# Altium footprint library CeleronLib_SMD.PcbLib: 198 footprints (part 7 of 13)
Each footprint in its own frame and in the unit in brackets; x right, y up, seen from the top. Pads: shape width x height; smd on the part's side, far side on the other; paste and mask are expansions set on the pad; w line width, h text height; cw(c..) or ccw(c..) is an arc to the next point about the centre after c.
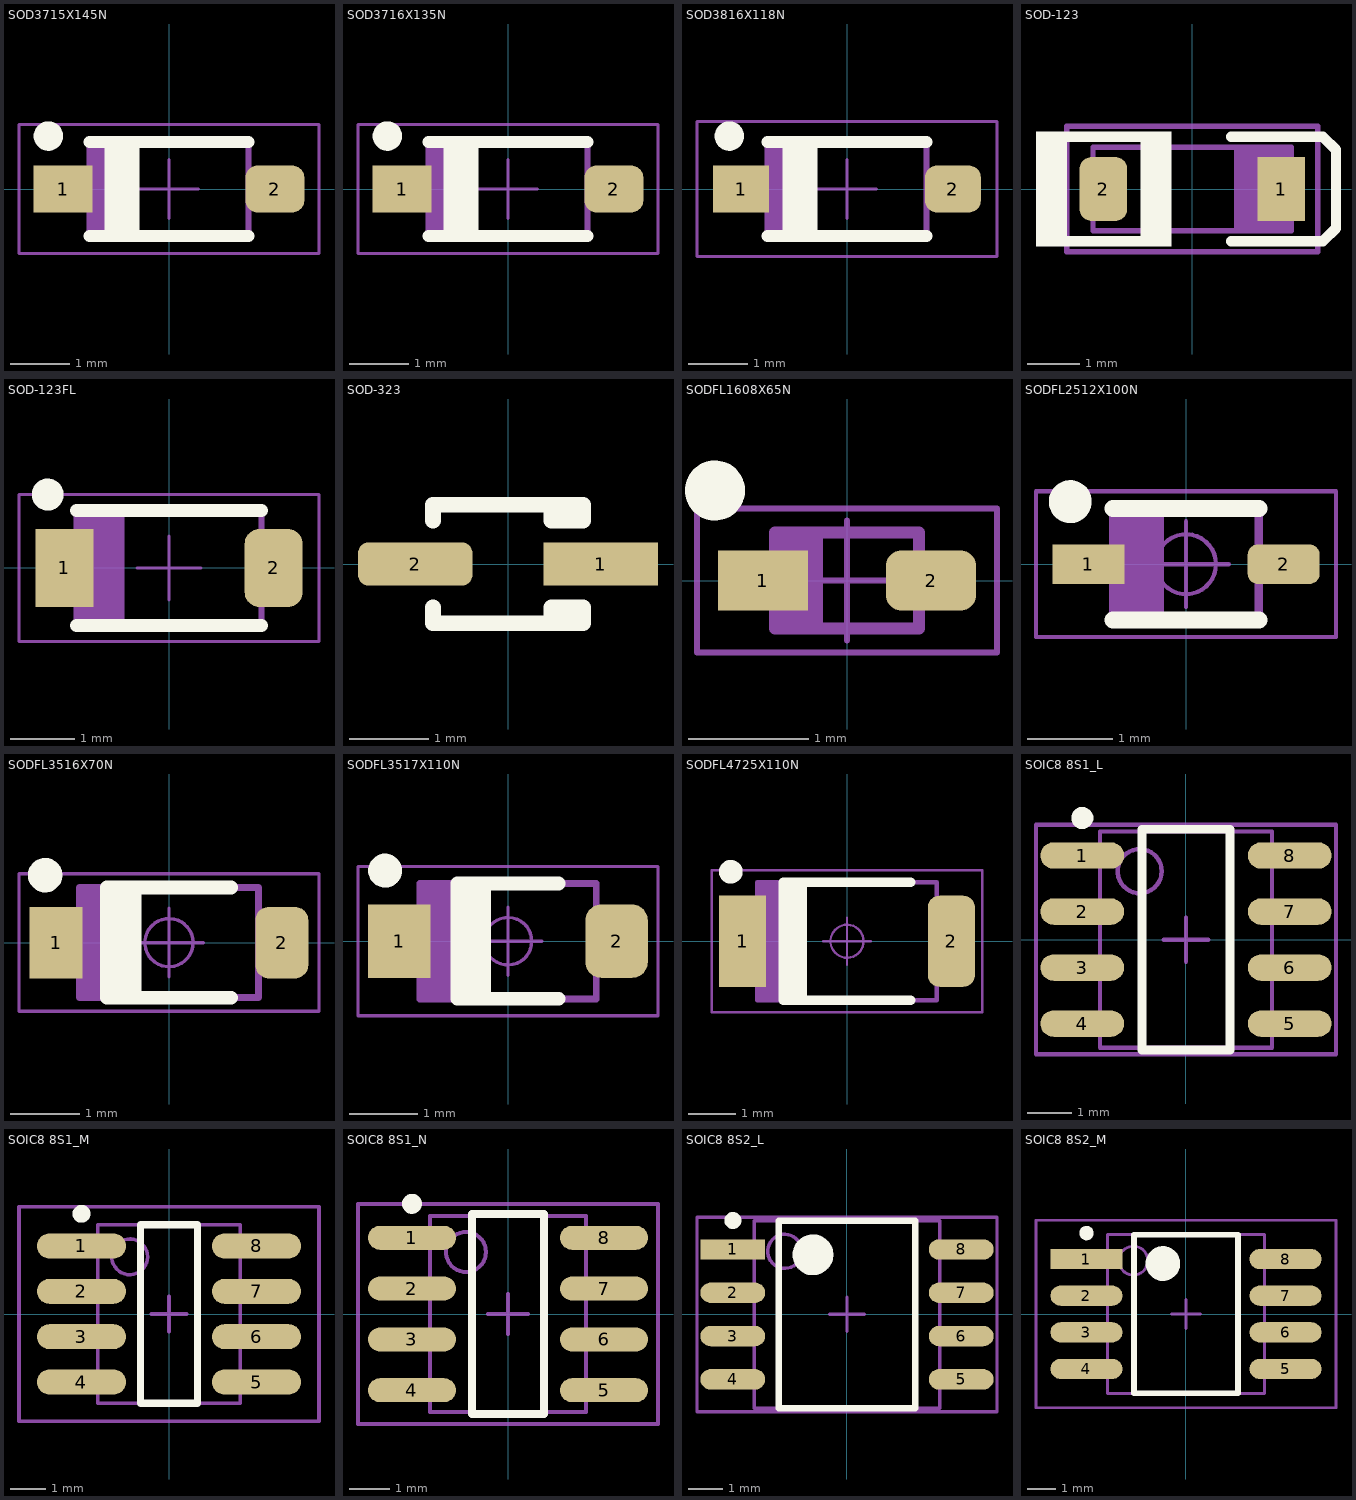
[diagram p6: the footprints below, top view; thin cyan lines are the x and y axes]

## SOD3715X145N [mm] "SOD Diode (SOD-123); 2.70mm W X 1.55mm L X 1.45mm H body, IPC Medium Density"
height 1.45
pads (2):
  rect 1x0.8 smd: 1(-1.8,0)
  rrect50% 1x0.8 smd: 2(1.8,0)
Top Overlay:
  circle w0.25: c-2.05,0.9 r0.125
  rectangle: -1,-0.8 -0.6,0.8
  lines w0.2: -1.35,-0.8 1.35,-0.8 ; -1.35,0.8 1.35,0.8 ; -1,-0.8 -1,0.8 ; -0.6,-0.8 -0.6,0.8
Top Assy:
  rectangle: -1.35,-0.775 -0.65,0.775
  lines w0.1: -1.35,-0.775 -1.35,0.775 1.35,0.775 1.35,-0.775 -1.35,-0.775
Top Courtyard:
  lines w0.05: -0.5,0 0.5,0 ; 0,-0.5 0,0.5 ; -2.55,-1.1 -2.55,1.1 2.55,1.1 2.55,-1.1 -2.55,-1.1
3D body: height 1.45, standoff 0, extent -1.95,-0.85 1.95,0.85

## SOD3716X135N [mm] "SOD Diode (SOD-123), 2.70mm W X 1.60mm L X 1.35mm H body, IPC Medium Density"
height 1.35
pads (2):
  rect 1x0.8 smd: 1(-1.8,0)
  rrect50% 1x0.8 smd: 2(1.8,0)
Top Overlay:
  circle w0.25: c-2.05,0.9 r0.125
  rectangle: -1,-0.8 -0.6,0.8
  lines w0.2: -1.35,-0.8 1.35,-0.8 ; -1.35,0.8 1.35,0.8 ; -1,-0.8 -1,0.8 ; -0.6,-0.8 -0.6,0.8
Top Assy:
  rectangle: -1.35,-0.775 -0.65,0.775
  lines w0.1: -1.35,-0.775 1.35,-0.775 1.35,0.775 -1.35,0.775 -1.35,-0.775
Top Courtyard:
  lines w0.05: -0.5,0 0.5,0 ; 0,-0.5 0,0.5 ; -2.55,-1.1 2.55,-1.1 2.55,1.1 -2.55,1.1 -2.55,-1.1
3D body: height 1.35, standoff 0, extent -1.95,-0.85 1.95,0.85

## SOD3816X118N [mm] "SOD Diode (SOD-123); 2.70mm W X 1.60mm L X 1.18mm H body, IPC Medium Density"
height 1.18
pads (2):
  rect 0.95x0.8 smd: 1(-1.8,0)
  rrect50% 0.95x0.8 smd: 2(1.8,0)
Top Overlay:
  circle w0.25: c-2,0.9 r0.125
  rectangle: -1,-0.8 -0.6,0.8
  lines w0.2: -1.35,-0.8 1.35,-0.8 ; -1.35,0.8 1.35,0.8 ; -1,-0.8 -1,0.8 ; -0.6,-0.8 -0.6,0.8
Top Assy:
  rectangle: -1.35,-0.8 -0.65,0.8
  lines w0.1: -1.35,-0.8 1.35,-0.8 1.35,0.8 -1.35,0.8 -1.35,-0.8
Top Courtyard:
  lines w0.05: -0.5,0 0.5,0 ; 0,-0.5 0,0.5 ; -2.55,-1.15 2.55,-1.15 2.55,1.15 -2.55,1.15 -2.55,-1.15
3D body: height 1.18, standoff 0, extent -1.95,-0.901 1.95,0.899

## SOD-123 [mm] "2 - Anode +  1 - Catod - Линия"
pads (2):
  rect 0.91x1.22 smd: 1(1.7,0)
  rrect50% 0.91x1.22 smd: 2(-1.7,0)
Top Overlay:
  rectangle: -0.99,-1.1 -0.4,1.1
  rectangle: -2.99,-1.1 -2.4,1.1
  lines w0.2: -1,-1 -2.5,-1 -2.5,1 -1,1 ; 0.75,-1 2.5,-1 2.75,-0.75 2.75,0.75 2.5,1 0.75,1
Top Assy:
  rectangle: 0.8,-0.8 1.9,0.8
  lines w0.1: -1.9,-0.8 -1.9,0.8 1.9,0.8 1.9,-0.8 1.8,-0.8 -1.9,-0.8
Top Courtyard:
  lines w0.1: -2.4,-1.2 2.4,-1.2 2.4,1.2 -2.4,1.2 -2.4,-1.2
3D body: height 1.35, standoff 0, extent -1.85,-0.775 1.85,0.775

## SOD-123FL [mm] "Small Outline Diode Flat Lead (SOD-123FL), Body; 2.70mm L X 1.65mm W X 1.0mm H"
height 1
pads (2):
  rect 0.91x1.22 smd: 1(-1.64,0)
  rrect50% 0.91x1.22 smd: 2(1.64,0)
Top Overlay:
  circle w0.25: c-1.9,1.15 r0.125
  lines w0.2: -1.45,-0.9 1.45,-0.9 ; -1.45,0.9 1.45,0.9
Top Assy:
  rectangle: -1.45,-0.9 -0.75,0.9
  lines w0.1: -1.35,-0.9 -1.35,0.9 ; -1.25,-0.9 -1.25,0.9 ; -1.15,-0.9 -1.15,0.9 ; -1.05,-0.9 -1.05,0.9 ; -0.95,-0.9 -0.95,0.9 ; -0.85,-0.9 -0.85,0.9 ; -0.75,-0.9 -0.75,0.9 ; -1.45,-0.9 -1.45,0.9 1.45,0.9 1.45,-0.9 -1.45,-0.9
Top Courtyard:
  lines w0.05: -0.5,0 0.5,0 ; 0,-0.5 0,0.5 ; -2.35,-1.15 -2.35,1.15 2.35,1.15 2.35,-1.15 -2.35,-1.15
3D body: height 1, standoff 0, extent -1.75,-0.9 1.75,0.9

## SOD-323 [mm] "SOD-323/SC-76; 2 Leads; Body 1.7 x 1.3 mm, (LxW)"
height 1.1
pads (2):
  rect 1.45x0.55 smd: 1(1.175,0)
  rrect50% 1.45x0.55 smd: 2(-1.175,0)
Top Overlay:
  rectangle: 0.55,-0.75 0.95,-0.55
  rectangle: 0.55,0.55 0.95,0.75
  lines w0.2: -0.95,-0.55 -0.95,-0.75 0.95,-0.75 0.95,-0.55 0.55,-0.55 0.55,-0.75 ; -0.95,0.55 -0.95,0.75 0.95,0.75 0.95,0.55 0.55,0.55 0.55,0.75

## SODFL1608X65N [mm] "Ultra Small Outline Diode Flat Lead (SOD-523), Body; 1.2mm L X 0.8mm W X 0.65mm H, IPC Medium Density"
height 0.65
pads (2):
  rect 0.75x0.5 smd: 1(-0.7,0)
  rrect50% 0.75x0.5 smd: 2(0.7,0)
Top Overlay:
  circle w0.25: c-1.1,0.75 r0.125
Top Assy:
  rectangle: -0.6,-0.4 -0.2,0.4
  lines w0.1: -0.6,-0.4 -0.6,0.4 0.6,0.4 0.6,-0.4 -0.6,-0.4
Top Courtyard:
  lines w0.05: -0.5,0 0.5,0 ; 0,-0.5 0,0.5 ; -1.25,-0.6 -1.25,0.6 1.25,0.6 1.25,-0.6 -1.25,-0.6
3D body: height 0.65, standoff 0, extent -0.825,-0.425 0.825,0.425

## SODFL2512X100N [mm] "SODFL Diode; 1.70mm W X 1.25mm L X 1.00mm H body, IPC Medium Density"
height 1
pads (2):
  rect 0.84x0.46 smd: 1(-1.14,0)
  rrect50% 0.84x0.46 smd: 2(1.14,0)
Top Overlay:
  circle w0.25: c-1.35,0.73 r0.125
  lines w0.2: -0.85,-0.65 0.85,-0.65 ; -0.85,0.65 0.85,0.65
Top Assy:
  rectangle: -0.85,-0.625 -0.254,0.625
  lines w0.1: -0.85,-0.625 -0.85,0.625 0.85,0.625 0.85,-0.625 -0.85,-0.625
Top Courtyard:
  circle w0.05: c0,0 r0.35
  lines w0.05: -0.5,0 0.5,0 ; 0,-0.5 0,0.5 ; -1.75,-0.85 -1.75,0.85 1.75,0.85 1.75,-0.85 -1.75,-0.85
3D body: height 1, standoff 0, extent -1.35,-0.65 1.35,0.65

## SODFL3516X70N [mm] "SODFL Diode; 2.60mm W X 1.60mm L X 0.70mm H Body, IPC Medium Density"
height 0.7
pads (2):
  rect 0.77x1.04 smd: 1(-1.64,0)
  rrect50% 0.77x1.04 smd: 2(1.64,0)
Top Overlay:
  circle w0.25: c-1.8,0.98 r0.125
  rectangle: -0.9,-0.8 -0.5,0.8
  lines w0.2: -0.5,-0.8 -0.5,0.8 ; 0.9,-0.8 -0.9,-0.8 -0.9,0.8 0.9,0.8
Top Assy:
  rectangle: -1.3,-0.8 -0.508,0.8
  lines w0.1: -1.3,-0.8 1.3,-0.8 1.3,0.8 -1.3,0.8 -1.3,-0.8
Top Courtyard:
  circle w0.05: c0,0 r0.35
  lines w0.05: -0.5,0 0.5,0 ; 0,-0.5 0,0.5 ; -2.18,-1 2.18,-1 2.18,1 -2.18,1 -2.18,-1
3D body: height 0.7, standoff 0, extent -1.7,-0.8 1.7,0.8

## SODFL3517X110N [mm] "SODFL Diode (SOD123W); 2.60mm W X 1.70mm L X 1.10mm H body, IPC Medium Density"
height 1.1
pads (2):
  rect 0.92x1.08 smd: 1(-1.6,0)
  rrect50% 0.92x1.08 smd: 2(1.6,0)
Top Overlay:
  circle w0.25: c-1.81,1.04 r0.125
  rectangle: -0.75,-0.85 -0.35,0.85
  lines w0.2: -0.35,-0.85 -0.35,0.85 ; 0.75,-0.85 -0.75,-0.85 -0.75,0.85 0.75,0.85
Top Assy:
  rectangle: -1.3,-0.85 -0.508,0.85
  lines w0.1: -1.3,-0.85 1.3,-0.85 1.3,0.85 -1.3,0.85 -1.3,-0.85
Top Courtyard:
  circle w0.05: c0,0 r0.35
  lines w0.05: -0.5,0 0.5,0 ; 0,-0.5 0,0.5 ; -2.21,-1.1 2.21,-1.1 2.21,1.1 -2.21,1.1 -2.21,-1.1
3D body: height 1.1, standoff 0, extent -1.85,-0.95 1.85,0.95

## SODFL4725X110N [mm] "SOD128, SODFL Diode; 3.80mm W X 2.50mm L X 1.10mm H Body, IPC Medium Density"
height 1.1
pads (2):
  rect 1x1.93 smd: 1(-2.21,0)
  rrect50% 1x1.93 smd: 2(2.21,0)
Top Overlay:
  circle w0.25: c-2.46,1.47 r0.125
  rectangle: -1.35,-1.25 -0.95,1.25
  lines w0.2: -0.95,-1.25 -0.95,1.25 ; 1.35,-1.25 -1.35,-1.25 -1.35,1.25 1.35,1.25
Top Assy:
  rectangle: -1.9,-1.25 -1.016,1.25
  lines w0.1: -1.9,-1.25 1.9,-1.25 1.9,1.25 -1.9,1.25 -1.9,-1.25
Top Courtyard:
  circle w0.05: c0,0 r0.35
  lines w0.05: -0.5,0 0.5,0 ; 0,-0.5 0,0.5 ; -2.86,-1.5 2.86,-1.5 2.86,1.5 -2.86,1.5 -2.86,-1.5
3D body: height 1.1, standoff 0, extent -2.5,-1.35 2.5,1.35

## SOIC8 8S1_L [mm] "SOIC, 8-Leads, Body 4.9x3.9mm, Pitch 1.27mm, IPC High Density"
height 1.75
pads (8):
  oval 1.9x0.6 smd: 1(-2.35,1.905) 2(-2.35,0.635) 3(-2.35,-0.635) 4(-2.35,-1.905) 5(2.35,-1.905) 6(2.35,-0.635) 7(2.35,0.635) 8(2.35,1.905)
Top Overlay:
  circle w0.25: c-2.35,2.755 r0.125
  lines w0.2: -1,-2.5 -1,2.5 1,2.5 1,-2.5 -1,-2.5
Top Assy:
  circle w0.1: c-1.05,1.55 r0.5
  lines w0.1: -1.95,-2.45 -1.95,2.45 1.95,2.45 1.95,-2.45 -1.95,-2.45
Top Courtyard:
  lines w0.1: -0.5,0 0.5,0 ; 0,-0.5 0,0.5 ; -3.4,-2.6 -3.4,2.6 3.4,2.6 3.4,-2.6 -3.4,-2.6
3D body: height 1.75, standoff 0, extent -1.95,-2.45 1.95,2.45

## SOIC8 8S1_M [mm] "SOIC, 8-Leads, Body 4.9x3.9mm, Pitch 1.27mm, IPC Low Density"
height 1.75
pads (8):
  oval 2.5x0.7 smd: 1(-2.45,1.905) 2(-2.45,0.635) 3(-2.45,-0.635) 4(-2.45,-1.905) 5(2.45,-1.905) 6(2.45,-0.635) 7(2.45,0.635) 8(2.45,1.905)
Top Overlay:
  circle w0.25: c-2.45,2.805 r0.125
  lines w0.2: -0.8,-2.5 0.8,-2.5 0.8,2.5 -0.8,2.5 -0.8,-2.5
Top Assy:
  circle w0.1: c-1.1,1.6 r0.5
  lines w0.1: -2,-2.5 2,-2.5 2,2.5 -2,2.5 -2,-2.5
Top Courtyard:
  lines w0.1: -0.5,0 0.5,0 ; 0,-0.5 0,0.5 ; -4.2,-3 4.2,-3 4.2,3 -4.2,3 -4.2,-3
3D body: height 1.75, standoff 0, extent -2,-2.5 2,2.5

## SOIC8 8S1_N [mm] "SOIC, 8-Leads, Body 4.9x3.9mm, Pitch 1.27mm, IPC Medium Density"
height 1.75
pads (8):
  oval 2.2x0.6 smd: 1(-2.4,1.905) 2(-2.4,0.635) 3(-2.4,-0.635) 4(-2.4,-1.905) 5(2.4,-1.905) 6(2.4,-0.635) 7(2.4,0.635) 8(2.4,1.905)
Top Overlay:
  circle w0.25: c-2.4,2.755 r0.125
  lines w0.2: -0.9,-2.5 0.9,-2.5 0.9,2.5 -0.9,2.5 -0.9,-2.5
Top Assy:
  circle w0.1: c-1.05,1.55 r0.5
  lines w0.1: -1.95,-2.45 1.95,-2.45 1.95,2.45 -1.95,2.45 -1.95,-2.45
Top Courtyard:
  lines w0.1: -0.5,0 0.5,0 ; 0,-0.5 0,0.5 ; -3.75,-2.75 3.75,-2.75 3.75,2.75 -3.75,2.75 -3.75,-2.75
3D body: height 1.75, standoff 0, extent -1.95,-2.45 1.95,2.45

## SOIC8 8S2_L [mm] "8-Pin Small Outline Package 1.27 mm Pitch, IPC High Density"
height 2.03
pads (8):
  rect 1.9x0.6 smd: 1(-3.35,1.905)
  oval 1.9x0.6 smd: 2(-3.35,0.635) 3(-3.35,-0.635) 4(-3.35,-1.905) 5(3.35,-1.905) 6(3.35,-0.635) 7(3.35,0.635) 8(3.35,1.905)
Top Overlay:
  circle w0.6: c-1,1.75 r0.3
  circle w0.25: c-3.35,2.755 r0.125
  lines w0.2: -2,-2.75 2,-2.75 2,2.75 -2,2.75 -2,-2.75
Top Assy:
  circle w0.1: c-1.825,1.85 r0.5
  lines w0.1: -2.725,-2.75 2.725,-2.75 2.725,2.75 -2.725,2.75 -2.725,-2.75
Top Courtyard:
  lines w0.1: -0.5,0 0.5,0 ; 0,-0.5 0,0.5 ; -4.4,-2.85 4.4,-2.85 4.4,2.85 -4.4,2.85 -4.4,-2.85
3D body: height 2.03, standoff 0, extent -2.725,-2.75 2.725,2.75

## SOIC8 8S2_M [mm] "8-Pin Small Outline Package 1.27 mm Pitch, IPC Low Density"
height 2.03
pads (8):
  rect 2.5x0.7 smd: 1(-3.45,1.905)
  oval 2.5x0.7 smd: 2(-3.45,0.635) 3(-3.45,-0.635) 4(-3.45,-1.905) 5(3.45,-1.905) 6(3.45,-0.635) 7(3.45,0.635) 8(3.45,1.905)
Top Overlay:
  circle w0.25: c-3.45,2.805 r0.125
  circle w0.6: c-0.8,1.75 r0.3
  lines w0.2: -1.8,-2.75 -1.8,2.75 1.8,2.75 1.8,-2.75 -1.8,-2.75
Top Assy:
  circle w0.1: c-1.825,1.85 r0.5
  lines w0.1: -2.725,-2.75 -2.725,2.75 2.725,2.75 2.725,-2.75 -2.725,-2.75
Top Courtyard:
  lines w0.1: -0.5,0 0.5,0 ; 0,-0.5 0,0.5 ; -5.2,-3.25 -5.2,3.25 5.2,3.25 5.2,-3.25 -5.2,-3.25
3D body: height 2.03, standoff 0, extent -2.725,-2.75 2.725,2.75